# Altium footprint library LukaLIBRARY.PcbLib: 772 footprints (part 27 of 49)
Each footprint in its own frame and in the unit in brackets; x right, y up, seen from the top. Pads: shape width x height; smd on the part's side, far side on the other; paste and mask are expansions set on the pad; w line width, h text height; cw(c..) or ccw(c..) is an arc to the next point about the centre after c.
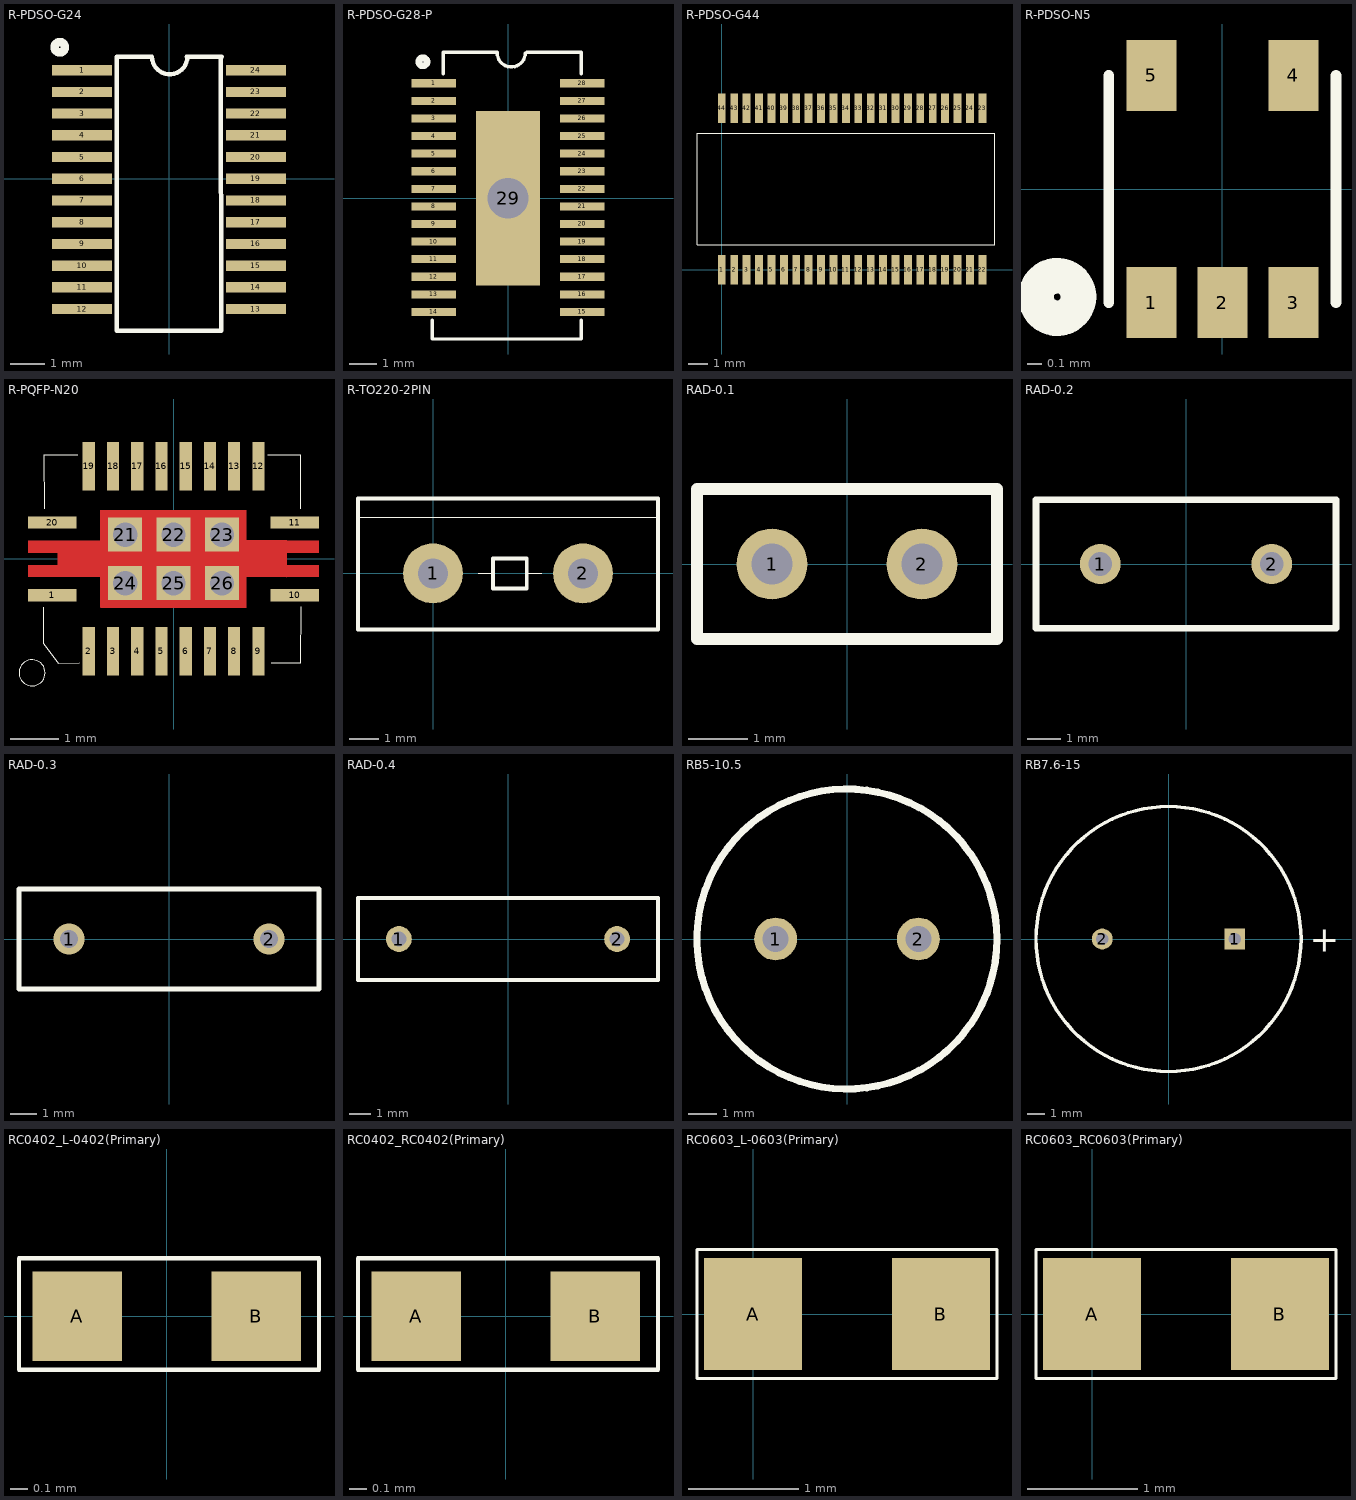
[diagram p26: the footprints below, top view; thin cyan lines are the x and y axes]

## R-PDSO-G24 [mm]
pads (24):
  rect 1.75x0.3 smd mask-25.4: 1(-2.54,3.175) 2(-2.54,2.54) 3(-2.54,1.905) 4(-2.54,1.27) 5(-2.54,0.635) 6(-2.54,0) 7(-2.54,-0.635) 8(-2.54,-1.27) 9(-2.54,-1.905) 10(-2.54,-2.54) 11(-2.54,-3.175) 12(-2.54,-3.81) 13(2.54,-3.81) 14(2.54,-3.175) 15(2.54,-2.54) 16(2.54,-1.905) 17(2.54,-1.27) 18(2.54,-0.635) 19(2.54,0) 20(2.54,0.635) 21(2.54,1.27) 22(2.54,1.905) 23(2.54,2.54) 24(2.54,3.175)
Top Overlay:
  circle w0.25: c-3.195,3.845 r0.15
  lines w0.127: 0.511,3.57 1.545,3.57 ; 0.537,3.57 cw(c0.02,3.57) -0.497,3.57 -1.53,3.57 -1.524,-4.445 1.524,-4.445 1.518,3.57
Top Solder:
  region: -3.415,-0.785 -1.665,-0.785 -1.665,-0.485 -3.415,-0.485
  region: -3.415,-1.42 -1.665,-1.42 -1.665,-1.12 -3.415,-1.12
  region: -3.415,-2.055 -1.665,-2.055 -1.665,-1.755 -3.415,-1.755
  region: -3.415,-2.69 -1.665,-2.69 -1.665,-2.39 -3.415,-2.39
  region: -3.415,-3.325 -1.665,-3.325 -1.665,-3.025 -3.415,-3.025
  region: -3.415,-3.96 -1.665,-3.96 -1.665,-3.66 -3.415,-3.66
  region: -3.415,3.025 -1.665,3.025 -1.665,3.325 -3.415,3.325
  region: -3.415,2.39 -1.665,2.39 -1.665,2.69 -3.415,2.69
  region: -3.415,1.755 -1.665,1.755 -1.665,2.055 -3.415,2.055
  region: -3.415,1.12 -1.665,1.12 -1.665,1.42 -3.415,1.42
  region: -3.415,0.485 -1.665,0.485 -1.665,0.785 -3.415,0.785
  region: 1.665,-3.96 3.415,-3.96 3.415,-3.66 1.665,-3.66
  region: 1.665,-3.325 3.415,-3.325 3.415,-3.025 1.665,-3.025
  region: 1.665,-2.69 3.415,-2.69 3.415,-2.39 1.665,-2.39
  region: 1.665,-2.055 3.415,-2.055 3.415,-1.755 1.665,-1.755
  region: 1.665,-1.42 3.415,-1.42 3.415,-1.12 1.665,-1.12
  region: 1.665,-0.785 3.415,-0.785 3.415,-0.485 1.665,-0.485
  region: 1.665,0.485 3.415,0.485 3.415,0.785 1.665,0.785
  region: 1.665,1.12 3.415,1.12 3.415,1.42 1.665,1.42
  region: 1.665,1.755 3.415,1.755 3.415,2.055 1.665,2.055
  region: 1.665,2.39 3.415,2.39 3.415,2.69 1.665,2.69
  region: 1.665,3.025 3.415,3.025 3.415,3.325 1.665,3.325
  region: -3.415,-0.15 -1.665,-0.15 -1.665,0.15 -3.415,0.15
  region: 1.665,-0.15 3.415,-0.15 3.415,0.15 1.665,0.15

## R-PDSO-G28-P [mm]
pads (29):
  rect 1.65x0.3 smd: 1(-2.75,4.25) 2(-2.75,3.6) 3(-2.75,2.95) 4(-2.75,2.3) 5(-2.75,1.65) 6(-2.75,1) 7(-2.75,0.35) 8(-2.75,-0.3) 9(-2.75,-0.95) 10(-2.75,-1.6) 11(-2.75,-2.25) 12(-2.75,-2.9) 13(-2.75,-3.55) 14(-2.75,-4.2) 15(2.75,-4.2) 16(2.75,-3.55) 17(2.75,-2.9) 18(2.75,-2.25) 19(2.75,-1.6) 20(2.75,-0.95) 21(2.75,-0.3) 22(2.75,0.35) 23(2.75,1) 24(2.75,1.65) 25(2.75,2.3) 26(2.75,2.95) 27(2.75,3.6) 28(2.75,4.25)
  rect 2.35x6.46 hole 1.5 mask-25.4: 29(0,0)
Top Overlay:
  circle w0.25: c-3.145,5.045 r0.15
  lines w0.127: -2.8,-4.5 -2.8,-5.2 2.7,-5.2 2.7,-4.5 ; -2.4,4.6 -2.4,5.4 -0.4,5.4 ; -0.397,5.37 ccw(c0.12,5.37) 0.637,5.37 ; 0.7,5.4 2.7,5.4 2.7,4.6
Top Solder:
  region: -1.175,-3.23 1.175,-3.23 1.175,3.23 -1.175,3.23
Bottom Solder:
  region: 0,1.261 -0.326,1.218 -0.63,1.092 -0.892,0.892 -1.092,0.63 -1.218,0.326 -1.261,0 -1.218,-0.326 -1.092,-0.63 -0.892,-0.892 -0.63,-1.092 -0.326,-1.218 0,-1.261 0.326,-1.218 0.63,-1.092 0.892,-0.892 1.092,-0.63 1.218,-0.326 1.261,0 1.218,0.326 1.092,0.63 0.892,0.892 0.63,1.092 0.326,1.218

## R-PDSO-G44 [mm]
pads (44):
  rect 0.4x1.5 smd: 1(0,0) 2(0.635,0) 3(1.27,0) 4(1.905,0) 5(2.54,0) 6(3.175,0) 7(3.81,0) 8(4.445,0) 9(5.08,0) 10(5.715,0) 11(6.35,0) 12(6.985,0) 13(7.62,0) 14(8.255,0) 15(8.89,0) 16(9.525,0) 17(10.16,0) 18(10.795,0) 19(11.43,0) 20(12.065,0) 21(12.7,0) 22(13.335,0) 23(13.335,8.255) 24(12.7,8.255) 25(12.065,8.255) 26(11.43,8.255) 27(10.795,8.255) 28(10.16,8.255) 29(9.525,8.255) 30(8.89,8.255) 31(8.255,8.255) 32(7.62,8.255) 33(6.985,8.255) 34(6.35,8.255) 35(5.715,8.255) 36(5.08,8.255) 37(4.445,8.255) 38(3.81,8.255) 39(3.175,8.255) 40(2.54,8.255) 41(1.905,8.255) 42(1.27,8.255) 43(0.635,8.255) 44(0,8.255)
Top Overlay:
  lines w0.025: -1.27,1.27 -1.27,6.985 13.97,6.985 13.97,1.27 -1.27,1.27

## R-PDSO-N5 [mm]
pads (5):
  rect 0.35x0.5 smd mask-25.4: 1(-0.5,-0.8) 2(0,-0.8) 3(0.5,-0.8) 4(0.5,0.8) 5(-0.5,0.8)
Top Overlay:
  circle w0.25: c-1.163,-0.76 r0.15
  lines w0.076: -0.8,-0.8 -0.8,0.8 ; 0.8,-0.8 0.8,0.8
Top Solder:
  region: -0.675,-1.05 -0.325,-1.05 -0.325,-0.55 -0.675,-0.55
  region: -0.175,-1.05 0.175,-1.05 0.175,-0.55 -0.175,-0.55
  region: 0.325,-1.05 0.675,-1.05 0.675,-0.55 0.325,-0.55
  region: 0.325,0.55 0.675,0.55 0.675,1.05 0.325,1.05
  region: -0.675,0.55 -0.325,0.55 -0.325,1.05 -0.675,1.05

## R-PQFP-N20 [mm]
pads (26):
  rect 1x0.25 smd mask-25.4: 1(-2.5,-0.75) 10(2.5,-0.75) 11(2.5,0.75) 20(-2.5,0.75)
  rect 0.25x1 smd mask-25.4: 2(-1.75,-1.91) 3(-1.25,-1.91) 4(-0.75,-1.91) 5(-0.25,-1.91) 6(0.25,-1.91) 7(0.75,-1.91) 8(1.25,-1.91) 9(1.75,-1.91) 12(1.75,1.91) 13(1.25,1.91) 14(0.75,1.91) 15(0.25,1.91) 16(-0.25,1.91) 17(-0.75,1.91) 18(-1.25,1.91) 19(-1.75,1.91)
  rect 0.7x0.7 hole 0.5 unplated mask-25.4: 21(-1,0.5) 22(0,0.5) 23(1,0.5) 24(-1,-0.5) 25(0,-0.5) 26(1,-0.5)
Top Layer:
  region: -2,0.37 -3,0.37 -3,0.13 -2,0.13
  region: -2,-0.13 -3,-0.13 -3,-0.37 -2,-0.37
  region: 3,-0.13 2,-0.13 2,-0.37 3,-0.37
  region: 3,0.37 2,0.37 2,0.13 3,0.13
  region: -2.39,0.37 -2.39,-0.37 -1.5,-0.37 -1.5,-1.01 1.5,-1 1.5,-0.37 2.33,-0.38 2.33,0.38 1.5,0.38 1.5,1 -1.5,1 -1.5,0.37
  lines w0.01: -1,0 1,0 ; -0.22,0 0.25,0 ; 0,-0.5 0,0.5 ; 0,-0.25 0,0.26 ; -1.5,-1 -1.5,1 1.5,1 1.5,-1 -1.5,-1
Top Overlay:
  circle w0.01: c-2.92,-2.35 r0.27
  lines w0.01: -2.68,-1 -2.68,-1.75 -2.38,-2.15 -1.95,-2.14 ; -2.67,1.03 -2.68,2.15 -1.98,2.15 ; 1.94,2.15 2.62,2.15 2.62,1.04 ; 2.01,-2.14 2.62,-2.14 2.63,-0.99
Top Solder:
  region: -3,-0.875 -2,-0.875 -2,-0.625 -3,-0.625
  region: -3,0.625 -2,0.625 -2,0.875 -3,0.875
  region: -1.625,-2.41 -1.625,-1.41 -1.875,-1.41 -1.875,-2.41
  region: -1.625,1.41 -1.625,2.41 -1.875,2.41 -1.875,1.41
  region: -1.125,-2.41 -1.125,-1.41 -1.375,-1.41 -1.375,-2.41
  region: 1.875,-2.41 1.875,-1.41 1.625,-1.41 1.625,-2.41
  region: 1.375,-2.41 1.375,-1.41 1.125,-1.41 1.125,-2.41
  region: 0.875,-2.41 0.875,-1.41 0.625,-1.41 0.625,-2.41
  region: 0.375,-2.41 0.375,-1.41 0.125,-1.41 0.125,-2.41
  region: -0.125,-2.41 -0.125,-1.41 -0.375,-1.41 -0.375,-2.41
  region: -0.625,-2.41 -0.625,-1.41 -0.875,-1.41 -0.875,-2.41
  region: -1.125,1.41 -1.125,2.41 -1.375,2.41 -1.375,1.41
  region: -0.125,1.41 -0.125,2.41 -0.375,2.41 -0.375,1.41
  region: 0.375,1.41 0.375,2.41 0.125,2.41 0.125,1.41
  region: 0.875,1.41 0.875,2.41 0.625,2.41 0.625,1.41
  region: 1.375,1.41 1.375,2.41 1.125,2.41 1.125,1.41
  region: 1.875,1.41 1.875,2.41 1.625,2.41 1.625,1.41
  region: -0.625,1.41 -0.625,2.41 -0.875,2.41 -0.875,1.41
  region: 3,0.875 2,0.875 2,0.625 3,0.625
  region: 2,-0.875 3,-0.875 3,-0.625 2,-0.625
  region: -1.35,0.15 -0.65,0.15 -0.65,0.85 -1.35,0.85
  region: -0.35,0.15 0.35,0.15 0.35,0.85 -0.35,0.85
  region: 0.65,0.15 1.35,0.15 1.35,0.85 0.65,0.85
  region: -1.35,-0.85 -0.65,-0.85 -0.65,-0.15 -1.35,-0.15
  region: -0.35,-0.85 0.35,-0.85 0.35,-0.15 -0.35,-0.15
  region: 0.65,-0.85 1.35,-0.85 1.35,-0.15 0.65,-0.15
  region: -3,-0.13 -3,-0.37 -1.5,-0.37 -1.5,-1 1.5,-1 1.5,-0.37 3,-0.37 3,-0.13 2.33,-0.13 2.33,0.13 3,0.13 3,0.37 1.5,0.37 1.5,1 -1.5,1 -1.5,0.36 -3,0.37 -3,0.36 -3,0.13 -2.39,0.13 -2.39,-0.13
Bottom Solder:
  region: -1.35,0.15 -0.65,0.15 -0.65,0.85 -1.35,0.85
  region: -0.35,0.15 0.35,0.15 0.35,0.85 -0.35,0.85
  region: 0.65,0.15 1.35,0.15 1.35,0.85 0.65,0.85
  region: -1.35,-0.85 -0.65,-0.85 -0.65,-0.15 -1.35,-0.15
  region: -0.35,-0.85 0.35,-0.85 0.35,-0.15 -0.35,-0.15
  region: 0.65,-0.85 1.35,-0.85 1.35,-0.15 0.65,-0.15

## R-TO220-2PIN [mil]
pads (2):
  round 80 hole 40: 1(0,0) 2(200,0)
Top Overlay:
  lines w1: -100,75 300,75 ; 60,0 80,0 ; 125,0 145,0
  lines w5: -100,-75 -100,100 300,100 300,-75 -100,-75 ; 80,-20 80,20 125,20 125,-20 80,-20

## RAD-0.1 [mm] "Radial Cap, Thru-Hole; 2 Leads; 0.1 in Pin Spacing"
pads (2):
  round 1.2 hole 0.7: 1(-1.27,0) 2(1.27,0)
Top Overlay:
  lines w0.2: -2.54,-1.27 -2.54,1.27 2.54,1.27 2.54,-1.27 -2.54,-1.27

## RAD-0.2 [mm] "Radial Cap, Thru-Hole; 2 Leads; 0.2 in Pin Spacing"
pads (2):
  round 1.2 hole 0.7: 1(-2.54,0) 2(2.54,0)
Top Overlay:
  lines w0.2: -4.445,-1.905 4.445,-1.905 4.445,1.905 -4.445,1.905 -4.445,-1.905

## RAD-0.3 [mm] "Radial Cap, Thru-Hole; 2 Leads; 0.3 in Pin Spacing"
height 6
pads (2):
  round 1.2 hole 0.7: 1(-3.81,0) 2(3.81,0)
Top Overlay:
  lines w0.2: -5.715,-1.905 -5.715,1.905 5.715,1.905 5.715,-1.905 -5.715,-1.905

## RAD-0.4 [mm] "Radial Cap, Thru-Hole; 2 Leads; 0.4 in Pin Spacing"
pads (2):
  round 1.2 hole 0.7: 1(-5.08,0) 2(5.08,0)
Top Overlay:
  lines w0.2: -6.985,-1.905 -6.985,1.905 6.985,1.905 6.985,-1.905 -6.985,-1.905

## RB5-10.5 [mm] "Capacitor (Radial); 2 Leads"
pads (2):
  round 1.5 hole 0.9: 1(-2.5,0) 2(2.5,0)
Top Overlay:
  circle w0.25: c0,0 r5.25
Mechanical 1:
  circle w0.02: c0,0 r5.25

## RB7.6-15 [mm] "Polarized Capacitor (Radial); 2 Leads"
pads (2):
  rect 1.2x1.2 hole 0.7: 1(3.81,0)
  round 1.2 hole 0.7: 2(-3.81,0)
Top Overlay:
  circle w0.2: c0,0 r7.62
  text "+" at 8.132,-0.737 h1.5

## RC0402_L-0402(Primary) [mil]
pads (2):
  rect 20x20 smd mask-1000: A(-20,0) B(20,0)
Top Overlay:
  lines w1: -33,-12 -33,13 34,13 34,-12 -33,-12
Top Solder:
  region: 10,-10 30,-10 30,10 10,10
  region: -30,-10 -10,-10 -10,10 -30,10

## RC0402_RC0402(Primary) [mil]
pads (2):
  rect 20x20 smd mask-1000: A(-20,0) B(20,0)
Top Overlay:
  lines w1: -33,-12 -33,13 34,13 34,-12 -33,-12
Top Solder:
  region: 10,-10 30,-10 30,10 10,10
  region: -30,-10 -10,-10 -10,10 -30,10

## RC0603_L-0603(Primary) [mil]
pads (2):
  rect 35x40 smd mask-1000: A(0,0) B(67,0)
Top Overlay:
  lines w1: -20,-23 87,-23 87,23 -20,23 -20,-23
Top Solder:
  region: -17.5,-20 17.5,-20 17.5,20 -17.5,20
  region: 49.5,-20 84.5,-20 84.5,20 49.5,20

## RC0603_RC0603(Primary) [mil]
pads (2):
  rect 35x40 smd mask-1000: A(0,0) B(67,0)
Top Overlay:
  lines w1: -20,-23 87,-23 87,23 -20,23 -20,-23
Top Solder:
  region: -17.5,-20 17.5,-20 17.5,20 -17.5,20
  region: 49.5,-20 84.5,-20 84.5,20 49.5,20